# Altium footprint library 7-Connectors-13.PcbLib: 44 footprints (part 2 of 5) (continued)
## 3M_N3793-5202RB [mm] "3M, 3000 Series, 10 Contacts - Pitch 2.54mm - Right Angle Four-Wall Header (Black) With Short Roll Pin Latch/Ejectors" (continued)
Mechanical 14:
  circle w0.1: c-10.986,0.533 r1.27
  circle w0.1: c-10.668,6.375 r0.787
  circle w0.1: c10.986,0.533 r1.27
  circle w0.1: c10.668,6.375 r0.787
  lines w0.1: -13.487,-2.007 -13.487,1.978 -10.986,3.422 -8.484,1.978 -8.484,-2.007 ; -11.989,14.249 -11.989,22.024 -11.836,22.112 -6.731,19.164 -6.731,15.799 -6.833,15.697 -11.989,15.697 ; -8.763,14.757 -8.763,20.337 ; -6.344,11.201 -5.074,9.002 -4.537,9.931 ; -4.769,11.201 -4.769,9.931 -2.851,9.931 -2.858,11.201 ; -2.032,5.105 2.032,5.105 ; -2.032,11.201 -2.032,3.581 2.032,3.581 2.032,11.201 ; -0.318,5.105 -0.318,11.201 ; 0.318,5.105 0.318,11.201 ; 8.484,-2.007 8.484,1.978 10.986,3.422 13.487,1.978 13.487,-2.007 ; 8.763,14.757 8.763,15.697 ; 11.989,14.249 11.989,22.024 ccw(c11.887,22.024) 11.836,22.112 6.731,19.164 6.731,15.799 ccw(c6.833,15.799) 6.833,15.697 11.989,15.697 ; -16.002,-2.007 -16.002,5.105 -12.674,14.249 -11.832,14.249 ccw(c-10.668,14.757) -9.398,14.757 -8.556,14.757 -8.114,12.251 ccw(c-6.863,12.471) -6.863,11.201 6.863,11.201 ccw(c6.863,12.471) 8.114,12.251 8.556,14.757 9.398,14.757 ccw(c10.668,14.757) 11.832,14.249 12.674,14.249 16.002,5.105 16.002,-2.007 -16.002,-2.007
  text "1" at -7.112,-1.7 h1.02
  text "10" at 6.34,0.889 h1.02
3D body "3M_N3793-5202RB.stp": height 8.64, standoff -3.94, extent -16.002,-2.007 16.002,22.125

## 3M_N3793-5302RB [mm] "3M, 3000 Series, 10 Contacts - Pitch 2.54mm - Right Angle Four-Wall Header (Black) With Long Roll Pin Latch/Ejectors"
height 8.6
pads (12):
  round 1.6 hole 0.9: 1(-5.08,-1.27) 2(-5.08,1.27) 3(-2.54,-1.27) 4(-2.54,1.27) 5(0,-1.27) 6(0,1.27) 7(2.54,-1.27) 8(2.54,1.27) 9(5.08,-1.27) 10(5.08,1.27)
  round 4.6 hole 2.8: MTG1(-10.986,0.533) MTG2(10.992,0.533)
Top Overlay:
  circle w0.2: c-5.153,-3.048 r0.15
  circle w0.2: c10.668,6.375 r0.787
  circle w0.2: c-10.668,6.375 r0.787
  lines w0.2: -12.89,-2.007 -16.002,-2.007 -16.002,5.105 -12.674,14.249 -11.832,14.249 ccw(c-10.668,14.757) -9.398,14.757 -8.556,14.757 -8.114,12.251 ccw(c-6.863,12.471) -6.863,11.201 6.863,11.201 ccw(c6.863,12.471) 8.114,12.251 8.556,14.757 9.398,14.757 ccw(c10.668,14.757) 11.832,14.249 12.674,14.249 16.002,5.105 16.002,-2.007 12.89,-2.007 ; -11.989,14.249 -11.989,24.561 -11.836,24.649 -6.731,21.702 -6.731,18.336 -6.833,18.235 -11.989,18.235 ; -8.763,14.757 -8.763,22.875 ; -6.344,11.201 -5.074,9.002 -4.537,9.931 ; -4.769,11.201 -4.769,9.931 -2.851,9.931 -2.858,11.201 ; -2.032,5.105 2.032,5.105 ; -2.032,11.201 -2.032,3.581 2.032,3.581 2.032,11.201 ; -0.318,5.105 -0.318,11.201 ; 0.318,5.105 0.318,11.201 ; 8.763,22.875 8.787,14.757 ; 11.989,14.249 11.989,24.561 11.836,24.649 6.731,21.702 6.731,18.336 6.833,18.235 11.989,18.235
  text "10" at 6.34,0.889 h1.02
  text "1" at -7.112,-1.7 h1.02
Mechanical 8:
  lines w0.1: -11.986,0.533 -10.986,0.533 ; -10.986,-0.467 -10.986,0.533 ; -10.986,1.533 -10.986,0.533 ; -9.986,0.533 -10.986,0.533 ; -6.08,-1.27 -5.08,-1.27 ; -6.08,1.27 -5.08,1.27 ; -5.08,-2.27 -5.08,-1.27 ; -5.08,-0.27 -5.08,-1.27 ; -5.08,0.27 -5.08,1.27 ; -5.08,2.27 -5.08,1.27 ; -4.08,-1.27 -5.08,-1.27 ; -4.08,1.27 -5.08,1.27 ; -3.54,-1.27 -2.54,-1.27 ; -3.54,1.27 -2.54,1.27 ; -2.54,-2.27 -2.54,-1.27 ; -2.54,-0.27 -2.54,-1.27 ; -2.54,0.27 -2.54,1.27 ; -2.54,2.27 -2.54,1.27 ; -1.54,-1.27 -2.54,-1.27 ; -1.54,1.27 -2.54,1.27 ; -1,-1.27 0,-1.27 ; -1,0 0,0 ; -1,1.27 0,1.27 ; 0,-2.27 0,-1.27 ; 0,-1 0,0 ; 0,-0.27 0,-1.27 ; 0,0.27 0,1.27 ; 0,1 0,0 ; 0,2.27 0,1.27 ; 1,-1.27 0,-1.27 ; 1,0 0,0 ; 1,1.27 0,1.27 ; 1.54,-1.27 2.54,-1.27 ; 1.54,1.27 2.54,1.27 ; 2.54,-2.27 2.54,-1.27 ; 2.54,-0.27 2.54,-1.27 ; 2.54,0.27 2.54,1.27 ; 2.54,2.27 2.54,1.27 ; 3.54,-1.27 2.54,-1.27 ; 3.54,1.27 2.54,1.27 ; 4.08,-1.27 5.08,-1.27 ; 4.08,1.27 5.08,1.27 ; 5.08,-2.27 5.08,-1.27 ; 5.08,-0.27 5.08,-1.27 ; 5.08,0.27 5.08,1.27 ; 5.08,2.27 5.08,1.27 ; 6.08,-1.27 5.08,-1.27 ; 6.08,1.27 5.08,1.27 ; 9.992,0.533 10.992,0.533 ; 10.992,-0.467 10.992,0.533 ; 10.992,1.533 10.992,0.533 ; 11.992,0.533 10.992,0.533
Mechanical 14:
  circle w0.1: c10.668,6.375 r0.787
  circle w0.1: c10.986,0.533 r1.27
  circle w0.1: c-10.668,6.375 r0.787
  circle w0.1: c-10.986,0.533 r1.27
  lines w0.1: -13.487,-2.007 -13.487,1.978 -10.986,3.422 -8.484,1.978 -8.484,-2.007 ; -11.989,14.249 -11.989,24.561 -11.836,24.649 -6.731,21.702 -6.731,18.336 -6.833,18.235 -11.989,18.235 ; -8.763,14.757 -8.763,22.875 ; -6.344,11.201 -5.074,9.002 -4.537,9.931 ; -4.769,11.201 -4.769,9.931 -2.851,9.931 -2.858,11.201 ; -2.032,5.105 2.032,5.105 ; -2.032,11.201 -2.032,3.581 2.032,3.581 2.032,11.201 ; -0.318,5.105 -0.318,11.201 ; 0.318,5.105 0.318,11.201 ; 8.484,-2.007 8.484,1.978 10.986,3.422 13.487,1.978 13.487,-2.007 ; 8.763,22.875 8.787,14.757 ; 11.989,14.249 11.989,24.561 11.836,24.649 6.731,21.702 6.731,18.336 6.833,18.235 11.989,18.235 ; -16.002,-2.007 16.002,-2.007 16.002,5.105 12.674,14.249 11.832,14.249 cw(c10.668,14.757) 9.398,14.757 8.556,14.757 8.114,12.251 cw(c6.863,12.471) 6.863,11.201 -6.863,11.201 cw(c-6.863,12.471) -8.114,12.251 -8.556,14.757 -9.398,14.757 cw(c-10.668,14.757) -11.832,14.249 -12.674,14.249 -16.002,5.105 -16.002,-2.007
  text "10" at 6.34,0.889 h1.02
  text "1" at -7.112,-1.7 h1.02
3D body "3M_N3793-5302RB.stp": height 8.64, standoff -3.94, extent -16.002,-2.007 16.002,24.663

## 3M_N3793-D202RB [mm] "3M, 3000 Series, 2x10 Contacts - Pitch 2.54mm - Right Angle Four-Wall Condo Header (Black) With Short Roll Pin Latch/Ejectors"
height 15.5
pads (22):
  round 1.7 hole 1: 1L(-5.08,1.27) 1U(-5.08,-3.81) 2L(-5.08,3.81) 2U(-5.08,-1.27) 3L(-2.54,1.27) 3U(-2.54,-3.81) 4L(-2.54,3.81) 4U(-2.54,-1.27) 5L(0,1.27) 5U(0,-3.81) 6L(0,3.81) 6U(0,-1.27) 7L(2.54,1.27) 7U(2.54,-3.81) 8L(2.54,3.81) 8U(2.54,-1.27) 9L(5.08,1.27) 9U(5.08,-3.81) 10L(5.08,3.81) 10U(5.08,-1.27)
  round 4.6 hole 2.6: MTG1(-10.985,3.073) MTG2(10.985,3.073)
Top Overlay:
  circle w0.2: c-5.153,-5.913 r0.15
  circle w0.2: c10.668,8.915 r0.953
  circle w0.2: c-10.668,8.915 r0.953
  lines w0.2: -22.423,16.687 -14.159,12.71 ; -19.64,11.768 -17.36,16.505 -20.484,18.009 -25.5,14.588 -18.069,11.011 -15.671,8.554 ; -11.989,16.789 -11.989,24.74 -6.731,21.704 -6.731,18.237 -11.989,18.237 ; -8.763,17.297 -8.763,22.877 ; -6.829,13.741 -4.763,13.741 ; -6.318,13.741 -5.048,11.542 -4.511,12.471 ; -2.858,13.741 -2.032,13.741 ; -2.851,13.741 -2.851,12.471 -4.769,12.471 -4.769,13.741 -6.794,13.741 cw(c-6.829,15.053) -8.126,14.859 -8.556,17.297 -9.398,17.297 cw(c-10.668,17.297) -11.832,16.789 -12.674,16.789 -16.002,7.645 -16.002,-5.309 16.002,-5.309 16.002,7.645 12.674,16.789 11.832,16.789 cw(c10.668,17.297) 9.398,17.297 8.556,17.297 8.126,14.859 cw(c6.829,15.053) 6.794,13.741 2.032,13.741 ; 8.763,17.297 8.763,22.877 ; 11.989,16.789 11.989,24.74 6.731,21.704 6.731,18.237 11.989,18.237 ; 14.159,12.71 22.423,16.687 ; 15.671,8.554 18.069,11.011 25.5,14.588 20.484,18.009 17.36,16.505 19.64,11.768 ; -2.032,6.121 2.032,6.121 ; -2.032,6.121 -2.032,13.741 ; -2.032,6.121 -2.032,13.741 ; -2.032,6.121 2.032,6.121 ; 2.032,6.121 2.032,13.741 ; 2.032,6.121 2.032,13.741 ; -16.002,0.533 -14.542,0.533 -16.002,0.533 ; -2.032,7.645 2.032,7.645 -2.032,7.645 ; 14.542,0.533 16.002,0.533 14.542,0.533
  text "1" at -7.112,0.84 h1.02
  text "LOWER" at -7.685,5.465 h1
  text "1" at -7.112,-4.24 h1.02
  text "UPPER" at -12.59,-4.25 h1
  text "10" at 6.34,-1.651 h1.02
  text "10" at 6.34,3.429 h1.02
Mechanical 8:
  lines w0.1: -5.58,-3.81 -5.08,-3.81 ; -5.58,-1.27 -5.08,-1.27 ; -5.58,1.27 -5.08,1.27 ; -5.58,3.81 -5.08,3.81 ; -5.08,-4.31 -5.08,-3.81 ; -5.08,-3.31 -5.08,-3.81 ; -5.08,-1.77 -5.08,-1.27 ; -5.08,-0.77 -5.08,-1.27 ; -5.08,0.77 -5.08,1.27 ; -5.08,1.77 -5.08,1.27 ; -5.08,3.31 -5.08,3.81 ; -5.08,4.31 -5.08,3.81 ; -4.58,-3.81 -5.08,-3.81 ; -4.58,-1.27 -5.08,-1.27 ; -4.58,1.27 -5.08,1.27 ; -4.58,3.81 -5.08,3.81 ; -3.04,-3.81 -2.54,-3.81 ; -3.04,-1.27 -2.54,-1.27 ; -3.04,1.27 -2.54,1.27 ; -3.04,3.81 -2.54,3.81 ; -2.54,-4.31 -2.54,-3.81 ; -2.54,-3.31 -2.54,-3.81 ; -2.54,-1.77 -2.54,-1.27 ; -2.54,-0.77 -2.54,-1.27 ; -2.54,0.77 -2.54,1.27 ; -2.54,1.77 -2.54,1.27 ; -2.54,3.31 -2.54,3.81 ; -2.54,4.31 -2.54,3.81 ; -2.04,-3.81 -2.54,-3.81 ; -2.04,-1.27 -2.54,-1.27 ; -2.04,1.27 -2.54,1.27 ; -2.04,3.81 -2.54,3.81 ; -0.5,-3.81 0,-3.81 ; -0.5,-1.27 0,-1.27 ; -0.5,1.27 0,1.27 ; -0.5,3.81 0,3.81 ; 0,-4.31 0,-3.81 ; 0,-3.31 0,-3.81 ; 0,-1.77 0,-1.27 ; 0,-0.77 0,-1.27 ; 0,0.77 0,1.27 ; 0,1.77 0,1.27 ; 0,3.31 0,3.81 ; 0,4.31 0,3.81 ; 0.5,-3.81 0,-3.81 ; 0.5,-1.27 0,-1.27 ; 0.5,1.27 0,1.27 ; 0.5,3.81 0,3.81 ; 2.04,-3.81 2.54,-3.81 ; 2.04,-1.27 2.54,-1.27 ; 2.04,1.27 2.54,1.27 ; 2.04,3.81 2.54,3.81 ; 2.54,-4.31 2.54,-3.81 ; 2.54,-3.31 2.54,-3.81 ; 2.54,-1.77 2.54,-1.27 ; 2.54,-0.77 2.54,-1.27 ; 2.54,0.77 2.54,1.27 ; 2.54,1.77 2.54,1.27 ; 2.54,3.31 2.54,3.81 ; 2.54,4.31 2.54,3.81 ; 3.04,-3.81 2.54,-3.81 ; 3.04,-1.27 2.54,-1.27 ; 3.04,1.27 2.54,1.27 ; 3.04,3.81 2.54,3.81 ; 4.58,-3.81 5.08,-3.81 ; 4.58,-1.27 5.08,-1.27 ; 4.58,1.27 5.08,1.27 ; 4.58,3.81 5.08,3.81 ; 5.08,-4.31 5.08,-3.81 ; 5.08,-3.31 5.08,-3.81 ; 5.08,-1.77 5.08,-1.27 ; 5.08,-0.77 5.08,-1.27 ; 5.08,0.77 5.08,1.27 ; 5.08,1.77 5.08,1.27 ; 5.08,3.31 5.08,3.81 ; 5.08,4.31 5.08,3.81 ; 5.58,-3.81 5.08,-3.81 ; 5.58,-1.27 5.08,-1.27 ; 5.58,1.27 5.08,1.27 ; 5.58,3.81 5.08,3.81 ; 10.486,3.073 10.986,3.073 ; 10.986,2.573 10.986,3.073 ; 10.986,3.573 10.986,3.073 ; 11.486,3.073 10.986,3.073 ; 0,0 -0.5,0 0,0 ; 0,0 0,-0.5 0,0 ; 0,0 0.5,0 0,0 ; 0,0 0,0.5 0,0
Mechanical 14:
  circle w0.1: c10.668,8.915 r0.953
  circle w0.1: c-10.668,8.915 r0.953
  circle w0.1: c10.986,3.073 r1.27
  circle w0.1: c-10.986,3.073 r1.27
  lines w0.1: -22.423,16.687 -14.159,12.71 ; -19.64,11.768 -17.36,16.505 -20.484,18.009 -25.5,14.588 -18.069,11.011 -15.671,8.554 ; -11.989,16.789 -11.989,24.74 -6.731,21.704 -6.731,18.237 -11.989,18.237 ; -8.763,17.297 -8.763,22.877 ; -8.484,0.533 -8.484,4.518 -10.986,5.962 -13.487,4.518 -13.487,0.533 -13.526,0.533 cw(c-14.034,0.533) -14.542,0.533 -16.002,0.533 16.002,0.533 14.542,0.533 cw(c14.034,0.533) 13.526,0.533 13.487,0.533 13.487,4.518 10.986,5.962 8.484,4.518 8.484,0.533 ; -6.829,13.741 -4.763,13.741 ; -6.318,13.741 -5.048,11.542 -4.511,12.471 ; -2.858,13.741 -2.032,13.741 ; -2.851,13.741 -2.851,12.471 -4.769,12.471 -4.769,13.741 -6.794,13.741 cw(c-6.829,15.053) -8.126,14.859 -8.556,17.297 -9.398,17.297 cw(c-10.668,17.297) -11.832,16.789 -12.674,16.789 -16.002,7.645 -16.002,-5.309 16.002,-5.309 16.002,7.645 12.674,16.789 11.832,16.789 cw(c10.668,17.297) 9.398,17.297 8.556,17.297 8.126,14.859 cw(c6.829,15.053) 6.794,13.741 2.032,13.741 ; 8.763,17.297 8.763,22.877 ; 11.989,16.789 11.989,24.74 6.731,21.704 6.731,18.237 11.989,18.237 ; 14.159,12.71 22.423,16.687 ; 15.671,8.554 18.069,11.011 25.5,14.588 20.484,18.009 17.36,16.505 19.64,11.768 ; -2.032,6.121 2.032,6.121 ; -2.032,6.121 -2.032,13.741 ; -2.032,6.121 -2.032,13.741 ; -2.032,6.121 2.032,6.121 ; 2.032,6.121 2.032,13.741 ; 2.032,6.121 2.032,13.741 ; -2.032,7.645 2.032,7.645 -2.032,7.645
  text "1" at -7.112,0.84 h1.02
  text "LOWER" at -7.685,5.465 h1
  text "1" at -7.112,-4.24 h1.02
  text "UPPER" at -12.59,-4.25 h1
  text "10" at 6.34,3.429 h1.02
  text "10" at 6.34,-1.651 h1.02
3D body "3M_N3793-D202RB.stp": height 15.49, standoff -3.81, extent -25.398,-5.309 25.398,18.009

## CE [mm]
Top Overlay:
  lines w0.6: 0,-2.413 cw(c0,0) 0,2.413 ; 2.53,0 4.6,0 ; 4.826,-2.438 cw(c4.826,-0.025) 4.826,2.388
3D body "ce.stp": height 0.02, standoff 0, extent -2.725,-2.725 4.82,2.725

## MTGP720H320V6P [mm]
pads (1):
  round 7.2 hole 3.25: 1(0,0)
via -2.2,-1.35 diameter 1 hole 0.5
via -2.2,1.375 diameter 1 hole 0.5
via 0,2.525 diameter 1 hole 0.5
via 2.2,1.35 diameter 1 hole 0.5
via 0,-2.625 diameter 1 hole 0.5
via 2.2,-1.35 diameter 1 hole 0.5
Mechanical 8:
  circle w0.1: c0,0 r2.6
  circle w0.1: c0,0 r3.75
  lines w0.1: -2.657,1.625 -2.224,1.375 ; -2.632,-1.6 -2.199,-1.35 ; -2.474,0.942 -2.224,1.375 ; -2.449,-0.917 -2.199,-1.35 ; -1.974,1.808 -2.224,1.375 ; -1.949,-1.783 -2.199,-1.35 ; -1.791,1.125 -2.224,1.375 ; -1.766,-1.1 -2.199,-1.35 ; -0.5,-2.625 0,-2.625 ; -0.5,0 0,0 ; -0.5,2.525 0,2.525 ; 0,-3.125 0,-2.625 ; 0,-2.125 0,-2.625 ; 0,-0.5 0,0 ; 0,0.5 0,0 ; 0,2.025 0,2.525 ; 0,3.025 0,2.525 ; 0.5,-2.625 0,-2.625 ; 0.5,0 0,0 ; 0.5,2.525 0,2.525 ; 1.766,-1.1 2.199,-1.35 ; 1.766,1.1 2.199,1.35 ; 1.949,-1.783 2.199,-1.35 ; 1.949,1.783 2.199,1.35 ; 2.449,-0.917 2.199,-1.35 ; 2.449,0.917 2.199,1.35 ; 2.632,-1.6 2.199,-1.35 ; 2.632,1.6 2.199,1.35
Mechanical 14:
  circle w0.1: c0,0 r3.75
Mechanical 15:
  circle w0.05: c0,0 r3.85
3D body "mtgp720h320v6p.stp": height 0.1, standoff -1.75, extent -3.627,-3.627 3.628,3.628

## PB [mm]
Top Overlay:
  circle w0.5: c-0.031,0.013 r2.5
  lines w0.5: -1.737,1.719 1.675,-1.693
  text "Pb" at -1.536,-0.948 h3.05
3D body "pb.stp": height 0.02, standoff 0, extent -2.725,-2.725 2.725,2.725

## SOURIAU_EDA-01970-V1_MISC1 [mm] "SOURIAU UTG0187PVDEX Connector (VDE 7 Male Contacts Only 4 Used) Mounted On 20mm M3 Spacer"
height 35.6
pads (8):
  round 1.9 hole 1.2: 2(6.149,3.55) 4(0,-7.1) 5(-6.149,-3.55) 7(0,0)
  round 5.8 hole 3.5: MECH1(-13.5,13.5) MECH2(13.5,13.5) MECH3(13.5,-13.5) MECH4(-13.5,-13.5)
Top Overlay:
  circle w0.2: c-6.149,-3.55 r1.25
  circle w0.2: c0,-7.1 r1.25
  circle w0.2: c6.149,-3.55 r1.25
  circle w0.2: c6.149,3.55 r1.25
  circle w0.2: c0,7.1 r1.25
  circle w0.2: c-6.149,3.55 r1.25
  circle w0.2: c0,0 r14.25
  circle w0.2: c0,0 r13.75
  lines w0.2: -13.456,-2.829 -12.972,-2.699 ; -13.068,-4.278 -12.584,-4.148 ; -12.81,6.243 -14.053,6.959 -13.053,8.691 -11.81,7.973 ; -9.744,-9.701 -9.409,-9.329 ; -8.629,-10.705 -8.294,-10.333 ; -7.549,-1.125 -9.262,-2.114 cw(c0,0) -9.262,2.114 -7.549,1.125 ccw(c-6.149,3.55) -4.749,5.975 -6.462,6.964 cw(c0,0) -2.8,9.078 -2.8,7.1 ccw(c0,7.1) 2.8,7.1 2.8,9.078 cw(c0,0) 6.462,6.964 4.749,5.975 ccw(c6.149,3.55) 7.549,1.125 9.262,2.114 cw(c0,0) 9.262,-2.114 7.549,-1.125 ccw(c6.149,-3.55) 4.749,-5.975 6.462,-6.964 cw(c0,0) 2.8,-9.078 2.8,-7.1 ccw(c0,-7.1) -2.8,-7.1 -2.8,-9.078 cw(c0,0) -6.462,-6.964 -4.749,-5.975 ccw(c-6.149,-3.55) -7.41,-1.05 ; -1.6,13.657 -1.6,13.153 ccw(c0,0) 1.6,13.153 1.6,13.657 ; -1,-14.215 -1,-15.65 1,-15.65 0.998,-14.215 ; 0.228,-2.791 cw(c0,0) 2.303,-1.593 ; 8.294,-10.333 8.629,-10.705 ; 9.409,-9.329 9.744,-9.701 ; 11.812,7.972 13.053,8.691 14.053,6.959 12.81,6.241 ; 13.229,-0.75 13.73,-0.75 ; 13.229,0.75 13.73,0.75 ; -16.775,-14.275 ccw(c-14.275,-14.275) -14.275,-16.775 14.275,-16.775 ccw(c14.275,-14.275) 16.775,-14.275 16.775,14.275 ccw(c14.275,14.275) 14.275,16.775 -14.275,16.775 ccw(c-14.275,14.275) -16.775,14.275 -16.775,-14.275 ; -14.75,12.778 -14.75,14.222 -13.5,14.943 -12.25,14.222 -12.25,12.778 -13.5,12.057 -14.75,12.778 ; -2.303,-1.593 cw(c0,0) -0.228,-2.791 cw(c-1.3,-2.252) -2.303,-1.593 ; 12.25,-14.222 12.25,-12.778 13.5,-12.057 14.75,-12.778 14.75,-14.222 13.5,-14.943 12.25,-14.222
  text "VDE7M" at -3.5,14.8 h1.5
  text "1" at -0.415,10.124 h2
  text "2" at 8.56,5.421 h2
  text "3" at 8.975,-4.703 h2
  text "4" at 0.415,-10.124 h2
  text "5" at -8.56,-5.421 h2
  text "6" at -8.975,4.703 h2
  text "7" at -2.9,2.2 h2
Mechanical 8:
  lines w0.1: -14.5,-13.5 -13.5,-13.5 ; -14.5,13.5 -13.5,13.5 ; -13.5,-14.5 -13.5,-13.5 ; -13.5,-12.5 -13.5,-13.5 ; -13.5,12.5 -13.5,13.5 ; -13.5,14.5 -13.5,13.5 ; -12.5,-13.5 -13.5,-13.5 ; -12.5,13.5 -13.5,13.5 ; -7.149,-3.55 -6.149,-3.55 ; -7.149,3.55 -6.149,3.55 ; -6.149,-4.55 -6.149,-3.55 ; -6.149,-2.55 -6.149,-3.55 ; -6.149,2.55 -6.149,3.55 ; -6.149,4.55 -6.149,3.55 ; -5.149,-3.55 -6.149,-3.55 ; -5.149,3.55 -6.149,3.55 ; -1,-7.1 0,-7.1 ; -1,0 0,0 ; -1,7.1 0,7.1 ; 0,-8.1 0,-7.1 ; 0,-6.1 0,-7.1 ; 0,-1 0,0 ; 0,1 0,0 ; 0,6.1 0,7.1 ; 0,8.1 0,7.1 ; 1,-7.1 0,-7.1 ; 1,0 0,0 ; 1,7.1 0,7.1 ; 5.149,-3.55 6.149,-3.55 ; 5.149,3.55 6.149,3.55 ; 6.149,-4.55 6.149,-3.55 ; 6.149,-2.55 6.149,-3.55 ; 6.149,2.55 6.149,3.55 ; 6.149,4.55 6.149,3.55 ; 7.149,-3.55 6.149,-3.55 ; 7.149,3.55 6.149,3.55 ; 12.5,-13.5 13.5,-13.5 ; 12.5,13.5 13.5,13.5 ; 13.5,-14.5 13.5,-13.5 ; 13.5,-12.5 13.5,-13.5 ; 13.5,12.5 13.5,13.5 ; 13.5,14.5 13.5,13.5 ; 14.5,-13.5 13.5,-13.5 ; 14.5,13.5 13.5,13.5
Mechanical 14:
  circle w0.1: c-13.5,-13.5 r1.6
  circle w0.1: c-6.149,-3.55 r1.25
  circle w0.1: c0,-7.1 r1.25
  circle w0.1: c6.149,-3.55 r1.25
  circle w0.1: c6.149,3.55 r1.25
  circle w0.1: c0,7.1 r1.25
  circle w0.1: c-6.149,3.55 r1.25
  circle w0.1: c13.5,13.5 r1.6
  circle w0.1: c0,0 r14.25
  circle w0.1: c0,0 r13.75
  circle w0.1: c-13.5,13.5 r2.75
  circle w0.1: c13.5,-13.5 r2.75
  lines w0.1: -13.456,-2.829 -12.972,-2.699 ; -13.068,-4.278 -12.584,-4.148 ; -12.81,6.243 -14.053,6.959 -13.053,8.691 -11.81,7.973 ; -9.744,-9.701 -9.409,-9.329 ; -8.629,-10.705 -8.294,-10.333 ; -7.549,-1.125 -9.262,-2.114 cw(c0,0) -9.262,2.114 -7.549,1.125 ccw(c-6.149,3.55) -4.749,5.975 -6.462,6.964 cw(c0,0) -2.8,9.078 -2.8,7.1 ccw(c0,7.1) 2.8,7.1 2.8,9.078 cw(c0,0) 6.462,6.964 4.749,5.975 ccw(c6.149,3.55) 7.549,1.125 9.262,2.114 cw(c0,0) 9.262,-2.114 7.549,-1.125 ccw(c6.149,-3.55) 4.749,-5.975 6.462,-6.964 cw(c0,0) 2.8,-9.078 2.8,-7.1 ccw(c0,-7.1) -2.8,-7.1 -2.8,-9.078 cw(c0,0) -6.462,-6.964 -4.749,-5.975 ccw(c-6.149,-3.55) -7.41,-1.05 ; -1.6,13.657 -1.6,13.153 ccw(c0,0) 1.6,13.153 1.6,13.657 ; -1,-14.215 -1,-15.65 1,-15.65 0.998,-14.215 ; 0.228,-2.791 cw(c0,0) 2.303,-1.593 ; 8.294,-10.333 8.629,-10.705 ; 9.409,-9.329 9.744,-9.701 ; 11.812,7.972 13.053,8.691 14.053,6.959 12.81,6.241 ; 13.229,-0.75 13.73,-0.75 ; 13.229,0.75 13.73,0.75 ; -16.775,-14.275 ccw(c-14.275,-14.275) -14.275,-16.775 14.275,-16.775 ccw(c14.275,-14.275) 16.775,-14.275 16.775,14.275 ccw(c14.275,14.275) 14.275,16.775 -14.275,16.775 ccw(c-14.275,14.275) -16.775,14.275 -16.775,-14.275 ; -14.75,12.778 -14.75,14.222 -13.5,14.943 -12.25,14.222 -12.25,12.778 -13.5,12.057 -14.75,12.778 ; -2.303,-1.593 cw(c0,0) -0.228,-2.791 cw(c-1.3,-2.252) -2.303,-1.593 ; 12.25,-14.222 12.25,-12.778 13.5,-12.057 14.75,-12.778 14.75,-14.222 13.5,-14.943 12.25,-14.222
  text "VDE7M" at -3.5,14.8 h1.5
  text "1" at -0.415,10.124 h2
  text "2" at 8.56,5.421 h2
  text "3" at 8.975,-4.703 h2
  text "4" at 0.415,-10.124 h2
  text "5" at -8.56,-5.421 h2
  text "6" at -8.975,4.703 h2
  text "7" at -2.9,2.2 h2
3D body "EDA-01970-V1_misc1.stp": height 35.6, standoff -3.8, extent -16.775,-16.775 16.775,16.775

## SOURIAU_EDA-02304-V1-0 [mm] "Metalok Bantam Plastic Industrial Circular Connector, 8 Male Contacts, Shell Size 12, UTG0 Series"
height 31.7
pads (12):
  round 1.9 hole 1.2: A(2.002,4.034) B(4.476,0.913) C(3.474,-2.827) D(0,-4.505) E(-3.445,-2.827) F(-4.446,0.913) G(-2.002,4.034) H(0,0)
  round 6.2 hole 3.2: MECH1(-10.3,10.3) MECH2(10.3,10.3) MECH3(-10.3,-10.3) MECH4(10.3,-10.3)
Top Overlay:
  circle w0.2: c0,0 r9.5
  circle w0.2: c0,0 r9.5
  circle w0.2: c0,0 r6.7
  circle w0.2: c0,0 r8.75
  circle w0.2: c-4.45,0.9 r1.25
  circle w0.2: c-2,4 r1.25
  circle w0.2: c2,4 r1.25
  circle w0.2: c4.45,0.9 r1.25
  circle w0.2: c3.45,-2.85 r1.25
  circle w0.2: c0,-4.5 r1.25
  circle w0.2: c-3.45,-2.85 r1.25
  circle w0.2: c0,0 r1.25
  lines w0.2: -13.1,-8.3 -13.1,8.3 ; -8.659,3.908 -10.432,4.932 -9.487,6.568 -7.714,5.545 ; -8.632,-1.433 -7.661,-1.173 cw(c0,0) -1.65,7.572 -1.65,8.593 ; -8.3,-13.1 8.3,-13.1 ; -8.3,13.1 8.3,13.1 ; -8.192,-3.075 -7.221,-2.815 ccw(c0,0) -5.603,-5.355 -6.249,-6.125 ; -4.947,-7.218 -4.3,-6.447 ccw(c0,0) 3.722,-6.798 4.299,-7.621 ; -4.128,-0.308 -3.772,-1.642 ; -3.675,1.881 -2.775,3.019 ; -2.322,-3.389 -1.128,-3.961 ; -1.441,2.882 -0.559,1.118 ; -0.945,-9.453 -0.945,-11.5 0.945,-11.5 0.945,-9.453 ; 1.128,-3.961 2.322,-3.389 ; 1.65,8.593 1.65,7.572 cw(c0,0) 7.748,0.175 8.75,0.088 ; 2.775,3.019 3.675,1.881 ; 3.772,-1.642 4.128,-0.308 ; 5.691,-6.646 5.115,-5.823 ccw(c0,0) 7.6,-1.518 8.601,-1.606 ; 7.714,5.545 9.487,6.568 10.432,4.932 8.659,3.908 ; 13.1,-8.3 13.1,8.3
  text "G" at -4.521,3.293 h1.25
  text "F" at -6.066,-1.672 h1.25
  text "E" at -2.956,-5.556 h1.25
  text "B" at 4.306,2.523 h1.25
  text "C" at 4.947,-2.332 h1.25
  text "D" at 1.598,-5.883 h1.25
  text "A" at 0.035,5.026 h1.25
  text "H" at -0.4,1.485 h1.25
Mechanical 8:
  lines w0.1: -10.8,-10.3 -10.3,-10.3 ; -10.8,10.3 -10.3,10.3 ; -10.3,-10.8 -10.3,-10.3 ; -10.3,-9.8 -10.3,-10.3 ; -10.3,9.8 -10.3,10.3 ; -10.3,10.8 -10.3,10.3 ; -9.8,-10.3 -10.3,-10.3 ; -9.8,10.3 -10.3,10.3 ; -5.446,0.913 -4.446,0.913 ; -4.446,-0.087 -4.446,0.913 ; -4.446,1.913 -4.446,0.913 ; -4.445,-2.827 -3.445,-2.827 ; -3.445,-3.827 -3.445,-2.827 ; -3.445,-1.827 -3.445,-2.827 ; -3.446,0.913 -4.446,0.913 ; -3.002,4.034 -2.002,4.034 ; -2.445,-2.827 -3.445,-2.827 ; -2.002,3.034 -2.002,4.034 ; -2.002,5.034 -2.002,4.034 ; -1.002,4.034 -2.002,4.034 ; -1,-4.505 0,-4.505 ; -1,0 0,0 ; 0,-5.505 0,-4.505 ; 0,-3.505 0,-4.505 ; 0,-1 0,0 ; 0,1 0,0 ; 1,-4.505 0,-4.505 ; 1,0 0,0 ; 1.002,4.034 2.002,4.034 ; 2.002,3.034 2.002,4.034 ; 2.002,5.034 2.002,4.034 ; 2.474,-2.827 3.474,-2.827 ; 3.002,4.034 2.002,4.034 ; 3.474,-3.827 3.474,-2.827 ; 3.474,-1.827 3.474,-2.827 ; 3.476,0.913 4.476,0.913 ; 4.474,-2.827 3.474,-2.827 ; 4.476,-0.087 4.476,0.913 ; 4.476,1.913 4.476,0.913 ; 5.476,0.913 4.476,0.913 ; 9.8,-10.3 10.3,-10.3 ; 9.8,10.3 10.3,10.3 ; 10.3,-10.8 10.3,-10.3 ; 10.3,-9.8 10.3,-10.3 ; 10.3,9.8 10.3,10.3 ; 10.3,10.8 10.3,10.3 ; 10.8,-10.3 10.3,-10.3 ; 10.8,10.3 10.3,10.3
Mechanical 14:
  circle w0.1: c0,0 r9.5
  circle w0.1: c-10.3,-10.3 r2.75
  circle w0.1: c-10.3,10.3 r2.75
  circle w0.1: c10.3,-10.3 r2.75
  circle w0.1: c10.3,10.3 r2.75
  circle w0.1: c0,0 r9.5
  circle w0.1: c0,0 r6.7
  circle w0.1: c0,0 r8.75
  circle w0.1: c-4.45,0.9 r1.25
  circle w0.1: c-2,4 r1.25
  circle w0.1: c2,4 r1.25
  circle w0.1: c4.45,0.9 r1.25
  circle w0.1: c3.45,-2.85 r1.25
  circle w0.1: c0,-4.5 r1.25
  circle w0.1: c-3.45,-2.85 r1.25
  circle w0.1: c0,0 r1.25
  lines w0.1: -8.659,3.908 -10.432,4.932 -9.487,6.568 -7.714,5.545 ; -8.632,-1.433 -7.661,-1.173 cw(c0,0) -1.65,7.572 -1.65,8.593 ; -8.192,-3.075 -7.221,-2.815 ccw(c0,0) -5.603,-5.355 -6.249,-6.125 ; -4.947,-7.218 -4.3,-6.447 ccw(c0,0) 3.722,-6.798 4.299,-7.621 ; -4.128,-0.308 -3.772,-1.642 ; -3.675,1.881 -2.775,3.019 ; -2.322,-3.389 -1.128,-3.961 ; -1.441,2.882 -0.559,1.118 ; -0.945,-9.453 -0.945,-11.5 0.945,-11.5 0.945,-9.453 ; 1.128,-3.961 2.322,-3.389 ; 1.65,8.593 1.65,7.572 cw(c0,0) 7.748,0.175 8.75,0.088 ; 2.775,3.019 3.675,1.881 ; 3.772,-1.642 4.128,-0.308 ; 5.691,-6.646 5.115,-5.823 ccw(c0,0) 7.6,-1.518 8.601,-1.606 ; 7.714,5.545 9.487,6.568 10.432,4.932 8.659,3.908 ; -13.187,-10.3 -11.743,-7.8 -8.857,-7.8 -7.413,-10.3 -8.857,-12.8 -11.743,-12.8 -13.187,-10.3 ; -13.187,10.3 -11.743,12.8 -8.857,12.8 -7.413,10.3 -8.857,7.8 -11.743,7.8 -13.187,10.3 ; -13.1,-11.6 -11.6,-13.1 11.6,-13.1 13.1,-11.6 13.1,11.6 11.6,13.1 -11.6,13.1 -13.1,11.6 -13.1,-11.6 ; 7.413,-10.3 8.857,-12.8 11.743,-12.8 13.187,-10.3 11.743,-7.8 8.857,-7.8 7.413,-10.3 ; 7.413,10.3 8.857,12.8 11.743,12.8 13.187,10.3 11.743,7.8 8.857,7.8 7.413,10.3
  text "G" at -4.521,3.293 h1.25
  text "F" at -6.066,-1.672 h1.25
  text "E" at -2.956,-5.556 h1.25
  text "B" at 4.306,2.523 h1.25
  text "C" at 4.947,-2.332 h1.25
  text "D" at 1.598,-5.883 h1.25
  text "A" at 0.035,5.026 h1.25
  text "H" at -0.4,1.485 h1.25
3D body "EDA-02304-V1-0.stp": height 33.7, standoff -13.8, extent -13.4,-13.4 13.399,13.4